# Altium footprint library microbuilder.PCBLIB: 422 footprints (part 13 of 27)
Each footprint in its own frame and in the unit in brackets; x right, y up, seen from the top. Pads: shape width x height; smd on the part's side, far side on the other; paste and mask are expansions set on the pad; w line width, h text height; cw(c..) or ccw(c..) is an arc to the next point about the centre after c.
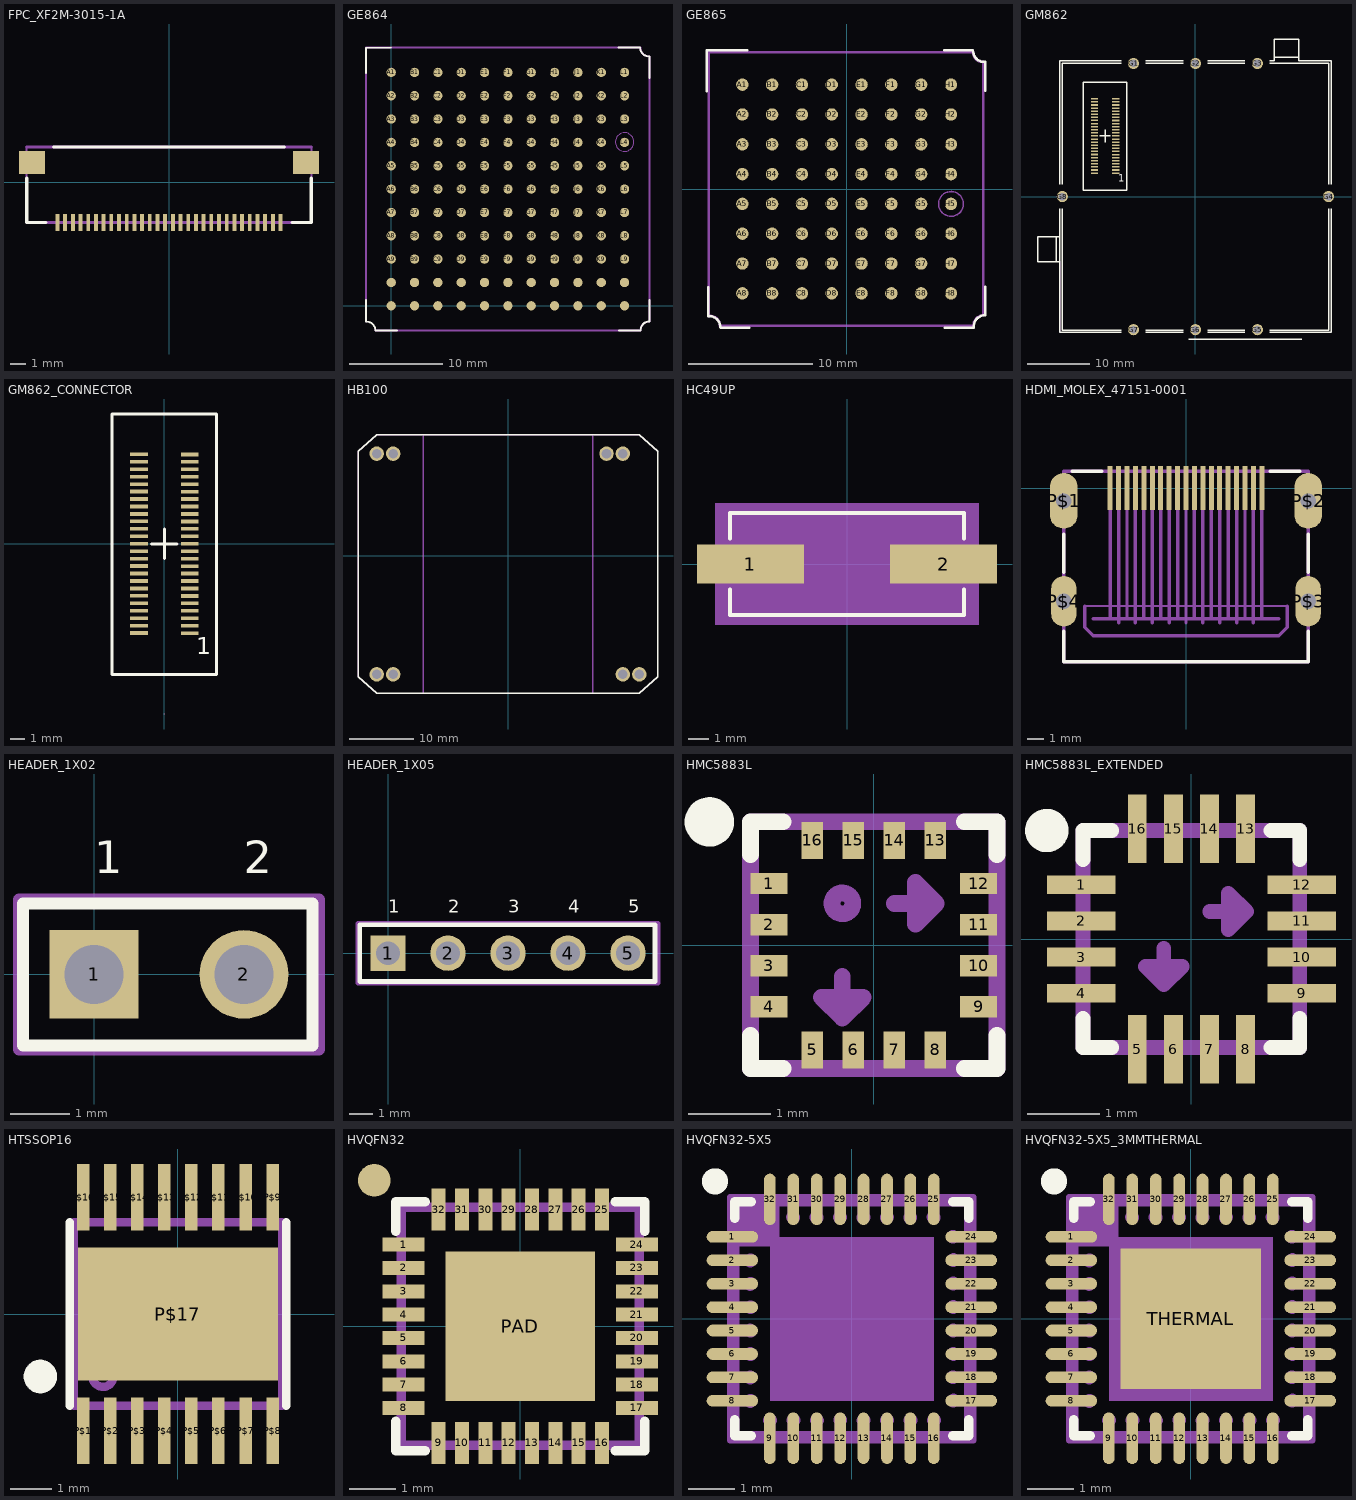
[diagram p12: the footprints below, top view; thin cyan lines are the x and y axes]

## FPC_XF2M-3015-1A [mm]
pads (32):
  rect 0.25x1.1 smd: P$1(7.25,-2.63) P$2(6.75,-2.63) P$3(6.25,-2.63) P$4(5.75,-2.63) P$5(5.25,-2.63) P$6(4.75,-2.63) P$7(4.25,-2.63) P$8(3.75,-2.63) P$9(3.25,-2.63) P$10(2.75,-2.63) P$11(2.25,-2.63) P$12(1.75,-2.63) P$13(1.25,-2.63) P$14(0.75,-2.63) P$15(0.25,-2.63) P$16(-0.25,-2.63) P$17(-0.75,-2.63) P$18(-1.25,-2.63) P$19(-1.75,-2.63) P$20(-2.25,-2.63) P$21(-2.75,-2.63) P$22(-3.25,-2.63) P$23(-3.75,-2.63) P$24(-4.25,-2.63) P$25(-4.75,-2.63) P$26(-5.25,-2.63) P$27(-5.75,-2.63) P$28(-6.25,-2.63) P$29(-6.75,-2.63) P$30(-7.25,-2.63)
  rect 1.7x1.5 smd: SUPPORT1(8.9,1.27) SUPPORT2(-8.9,1.27)
Top Overlay:
  lines w0.203: -9.25,0.27 -9.25,-2.63 -8,-2.63 ; -7.5,2.27 7.5,2.27 ; 8,-2.63 9.25,-2.63 9.25,0.27
Mechanical 16:
  lines w0.127: -9.25,-2.63 -9.25,2.27 ; 9.25,-2.63 9.25,2.27
  lines w0.203: -9.25,-2.63 9.25,-2.63 ; -9.25,2.27 9.25,2.27
  text "Bot" at -8.826,-1.881 h0.63
  text "30" at -7.556,-1.881 h0.63
  text "1" at 7.175,-1.881 h0.63
  text "30" at 6.921,-1.31 h0.63
  text "1" at -7.366,-1.31 h0.63
  text "Top" at -8.954,-1.31 h0.63

## GE864 [mm]
pads (121):
  rrect100% 1x1 smd: A1(0,25) A2(0,22.5) A3(0,20) A4(0,17.5) A5(0,15) A6(0,12.5) A7(0,10) A8(0,7.5) A9(0,5) A10(0,2.5) A11(0,0) B1(2.5,25) B2(2.5,22.5) B3(2.5,20) B4(2.5,17.5) B5(2.5,15) B6(2.5,12.5) B7(2.5,10) B8(2.5,7.5) B9(2.5,5) B10(2.5,2.5) B11(2.5,0) C1(5,25) C2(5,22.5) C3(5,20) C4(5,17.5) C5(5,15) C6(5,12.5) C7(5,10) C8(5,7.5) C9(5,5) C10(5,2.5) C11(5,0) D1(7.5,25) D2(7.5,22.5) D3(7.5,20) D4(7.5,17.5) D5(7.5,15) D6(7.5,12.5) D7(7.5,10) D8(7.5,7.5) D9(7.5,5) D10(7.5,2.5) D11(7.5,0) E1(10,25) E2(10,22.5) E3(10,20) E4(10,17.5) E5(10,15) E6(10,12.5) E7(10,10) E8(10,7.5) E9(10,5) E10(10,2.5) E11(10,0) F1(12.5,25) F2(12.5,22.5) F3(12.5,20) F4(12.5,17.5) F5(12.5,15) F6(12.5,12.5) F7(12.5,10) F8(12.5,7.5) F9(12.5,5) F10(12.5,2.5) F11(12.5,0) G1(15,25) G2(15,22.5) G3(15,20) G4(15,17.5) G5(15,15) G6(15,12.5) G7(15,10) G8(15,7.5) G9(15,5) G10(15,2.5) G11(15,0) H1(17.5,25) H2(17.5,22.5) H3(17.5,20) H4(17.5,17.5) H5(17.5,15) H6(17.5,12.5) H7(17.5,10) H8(17.5,7.5) H9(17.5,5) H10(17.5,2.5) H11(17.5,0) J1(20,25) J2(20,22.5) J3(20,20) J4(20,17.5) J5(20,15) J6(20,12.5) J7(20,10) J8(20,7.5) J9(20,5) J10(20,2.5) J11(20,0) K1(22.5,25) K2(22.5,22.5) K3(22.5,20) K4(22.5,17.5) K5(22.5,15) K6(22.5,12.5) K7(22.5,10) K8(22.5,7.5) K9(22.5,5) K10(22.5,2.5) K11(22.5,0) L1(25,25) L2(25,22.5) L3(25,20) L4(25,17.5) L5(25,15) L6(25,12.5) L7(25,10) L8(25,7.5) L9(25,5) L10(25,2.5) L11(25,0)
Top Overlay:
  lines w0.203: -2.692,-1.702 -2.692,0.61 ; -2.692,24.943 -2.692,27.635 0,27.635 ; -2.675,-1.706 cw(c-2.627,-2.632) -1.7,-2.631 ; -1.676,-2.642 0.61,-2.642 ; 24.359,27.661 26.645,27.661 ; 24.409,-2.667 26.721,-2.667 ; 26.668,27.65 ccw(c27.595,27.651) 27.644,26.725 ; 26.725,-2.65 cw(c27.651,-2.602) 27.65,-1.675 ; 27.661,-1.676 27.661,0.635 ; 27.661,24.409 27.661,26.721
Mechanical 16:
  lines w0.127: -2.65,-1.7 cw(c-2.626,-2.626) -1.7,-2.65
  lines w0.203: -2.65,-1.7 cw(c-2.65,-1.65) -2.7,-1.65 -2.7,27.65 26.7,27.65 ccw(c27.626,27.626) 27.65,26.7 27.65,-1.7 ccw(c27.626,-2.626) 26.7,-2.65 -1.7,-2.65
Mechanical 27:
  circle w0.127: c25,17.54 r1

## GE865 [mm]
pads (64):
  rrect100% 1x1 smd: A1(-8.4,8.4) A2(-8.4,6) A3(-8.4,3.6) A4(-8.4,1.2) A5(-8.4,-1.2) A6(-8.4,-3.6) A7(-8.4,-6) A8(-8.4,-8.4) B1(-6,8.4) B2(-6,6) B3(-6,3.6) B4(-6,1.2) B5(-6,-1.2) B6(-6,-3.6) B7(-6,-6) B8(-6,-8.4) C1(-3.6,8.4) C2(-3.6,6) C3(-3.6,3.6) C4(-3.6,1.2) C5(-3.6,-1.2) C6(-3.6,-3.6) C7(-3.6,-6) C8(-3.6,-8.4) D1(-1.2,8.4) D2(-1.2,6) D3(-1.2,3.6) D4(-1.2,1.2) D5(-1.2,-1.2) D6(-1.2,-3.6) D7(-1.2,-6) D8(-1.2,-8.4) E1(1.2,8.4) E2(1.2,6) E3(1.2,3.6) E4(1.2,1.2) E5(1.2,-1.2) E6(1.2,-3.6) E7(1.2,-6) E8(1.2,-8.4) F1(3.6,8.4) F2(3.6,6) F3(3.6,3.6) F4(3.6,1.2) F5(3.6,-1.2) F6(3.6,-3.6) F7(3.6,-6) F8(3.6,-8.4) G1(6,8.4) G2(6,6) G3(6,3.6) G4(6,1.2) G5(6,-1.2) G6(6,-3.6) G7(6,-6) G8(6,-8.4) H1(8.4,8.4) H2(8.4,6) H3(8.4,3.6) H4(8.4,1.2) H5(8.4,-1.2) H6(8.4,-3.6) H7(8.4,-6) H8(8.4,-8.4)
Top Overlay:
  lines w0.203: -11.261,7.859 -11.261,11.155 ; -11.261,11.161 -8.009,11.161 ; -11.161,-10.221 -11.161,-7.909 ; -11.143,-10.225 cw(c-11.095,-11.151) -10.168,-11.15 ; -10.145,-11.161 -7.859,-11.161 ; 7.859,11.161 10.145,11.161 ; 7.909,-11.161 10.221,-11.161 ; 10.168,11.15 ccw(c11.095,11.151) 11.143,10.225 ; 10.225,-11.143 cw(c11.151,-11.095) 11.15,-10.168 ; 11.161,-10.145 11.161,-7.859 ; 11.161,7.909 11.161,10.221
Mechanical 16:
  lines w0.203: -11.1,-10.2 -11.1,11 10.178,11 ccw(c10.954,11) 10.994,10.225 ; -11.094,-10.225 cw(c-11.014,-11.038) -10.198,-11 10.2,-11 ; 10.225,-10.994 cw(c11,-10.954) 11,-10.178 11,10.22
Mechanical 27:
  circle w0.127: c8.4,-1.2 r1

## GM862 [mil]
pads (58):
  rect 47.24x9.84 smd: 1(-507.8,149.25) 2(-641.67,149.39) 3(-507.8,168.94) 4(-641.67,169.07) 5(-507.8,188.62) 6(-641.67,188.76) 7(-507.8,208.31) 8(-641.67,208.44) 9(-507.8,227.99) 10(-641.67,228.13) 11(-507.85,247.62) 12(-641.67,247.81) 13(-507.8,267.36) 14(-641.67,267.5) 15(-507.8,287.05) 16(-641.67,287.18) 17(-507.8,306.73) 18(-641.67,306.87) 19(-507.8,326.42) 20(-641.67,326.55) 21(-507.8,346.1) 22(-641.67,346.24) 23(-507.8,365.79) 24(-641.67,365.92) 25(-507.8,385.47) 26(-641.67,385.61) 27(-507.8,405.16) 28(-641.67,405.29) 29(-507.8,424.84) 30(-641.67,424.98) 31(-507.8,444.53) 32(-641.67,444.66) 33(-507.8,464.21) 34(-641.67,464.35) 35(-507.8,483.9) 36(-641.67,484.03) 37(-507.8,503.58) 38(-641.67,503.72) 39(-507.8,523.27) 40(-641.67,523.4) 41(-507.8,542.95) 42(-641.67,543.09) 43(-507.8,562.64) 44(-641.67,562.77) 45(-507.8,582.32) 46(-641.67,582.46) 47(-507.8,602.01) 48(-641.67,602.14) 49(-507.8,621.69) 50(-641.67,621.83)
  round 70.86 hole 47.24: G1(-393.7,846.46) G2(0,846.46) G3(393.7,846.46) G4(846.46,0) G5(393.7,-846.46) G6(0,-846.46) G7(-393.7,-846.46) G8(-846.46,0)
Top Overlay:
  lines w8: -864.17,-78.74 -864.17,-255.91 ; -864.17,78.74 -864.17,864.17 -472.44,864.17 ; -848.43,-78.74 -848.43,-848.43 -472.44,-848.43 ; -848.43,78.74 -848.43,848.43 -472.44,848.43 ; -608.2,385.47 -541.27,385.47 ; -574.73,346.1 -574.73,424.84 ; -472.44,-864.17 -864.17,-864.17 -864.17,-413.39 ; -314.96,-864.17 -78.74,-864.17 ; -314.96,-848.43 -78.74,-848.43 ; -314.96,848.43 -78.74,848.43 ; -314.96,864.17 -78.74,864.17 ; -43.31,-905.51 677.17,-905.51 ; 78.74,-864.17 314.96,-864.17 ; 78.74,-848.43 314.96,-848.43 ; 78.74,848.43 314.96,848.43 ; 78.74,864.17 314.96,864.17 ; 472.44,-864.17 864.17,-864.17 864.17,-78.74 ; 472.44,-848.43 848.43,-848.43 848.43,-78.74 ; 472.44,848.43 848.43,848.43 848.43,78.74 ; 472.44,864.17 500,864.17 500,885.83 ; 864.17,78.74 864.17,864.17 657.48,864.17 657.48,885.83 ; -885.83,-413.39 -1001.97,-413.39 -1001.97,-255.91 -885.83,-255.91 ; -885.83,-413.39 -864.17,-413.39 ; -885.83,-413.39 -885.83,-255.91 ; -885.83,-255.91 -864.17,-255.91 ; -864.17,-413.39 -864.17,-255.91 ; 500,885.83 500,1001.97 657.48,1001.97 657.48,885.83 ; 500,885.83 657.48,885.83 ; -712.6,39.47 -437.01,39.47 -437.01,728.45 -712.6,728.45 -712.6,39.47
  text "1" at -490,77.1 h77.5
Mechanical 16:
  lines w8: -864.17,-864.17 -864.17,-413.39
  text "GSM" at -900,-399 h77.5
  text "GPS" at 517,900 h77.5

## GM862_CONNECTOR [mil]
pads (58):
  rect 47.24x9.84 smd: 1(67.2,-236.85) 2(-66.67,-236.72) 3(67.2,-217.17) 4(-66.67,-217.03) 5(67.2,-197.48) 6(-66.67,-197.35) 7(67.2,-177.8) 8(-66.67,-177.66) 9(67.2,-158.11) 10(-66.67,-157.98) 11(67.15,-138.48) 12(-66.67,-138.29) 13(67.2,-118.74) 14(-66.67,-118.61) 15(67.2,-99.06) 16(-66.67,-98.92) 17(67.2,-79.37) 18(-66.67,-79.24) 19(67.2,-59.69) 20(-66.67,-59.55) 21(67.2,-40) 22(-66.67,-39.87) 23(67.2,-20.32) 24(-66.67,-20.18) 25(67.2,-0.63) 26(-66.67,-0.5) 27(67.2,19.06) 28(-66.67,19.19) 29(67.2,38.74) 30(-66.67,38.87) 31(67.2,58.43) 32(-66.67,58.56) 33(67.2,78.11) 34(-66.67,78.24) 35(67.2,97.8) 36(-66.67,97.93) 37(67.2,117.48) 38(-66.67,117.61) 39(67.2,137.17) 40(-66.67,137.3) 41(67.2,156.85) 42(-66.67,156.98) 43(67.2,176.54) 44(-66.67,176.67) 45(67.2,196.22) 46(-66.67,196.35) 47(67.2,215.91) 48(-66.67,216.04) 49(67.2,235.59) 50(-66.67,235.72)
  round 1 hole 1: G1(0,-450) G2(0,-450) G3(0,-450) G4(0,-450) G5(0,-450) G6(0,-450) G7(0,-450) G8(0,-450)
Top Overlay:
  lines w8: -33.2,-0.63 33.73,-0.63 ; 0.27,-40 0.27,38.74 ; -137.6,-346.63 -137.6,342.35 137.99,342.35 137.99,-346.63 -137.6,-346.63
  text "1" at 85,-309 h77.5

## HB100 [mm]
pads (8):
  round 2.25 hole 1.5: 5V@1(-17.81,15.83) 5V@2(-20.35,15.83) GND@1(17.81,15.83) GND@2(15.27,15.83) GND@3(20.35,-18.37) GND@4(17.81,-18.37) IF@1(-17.81,-18.37) IF@2(-20.35,-18.37)
Top Overlay:
  lines w0.203: -23.25,-18.73 -23.25,16.19 -20.35,18.73 20.35,18.73 23.25,16.19 23.25,-18.73 20.35,-21.27 -20.32,-21.27 -23.25,-18.73
Mechanical 16:
  lines w0.127: -23.25,-18.73 -23.25,16.19 -20.35,18.73 -13.1,18.73 13.1,18.73 20.35,18.73 23.25,16.19 23.25,-18.73 20.35,-21.27 13.1,-21.27 -20.32,-21.27 -23.25,-18.73
  lines w0.203: -13.1,-21.27 -13.1,18.73 ; 13.1,-21.27 13.1,18.73
Mechanical 30:
  lines w0.127: -20.35,-21.27 -20.32,-21.27

## HC49UP [mil]
pads (2):
  rect 210x76 smd: 1(-190,0) 2(190,0)
Top Overlay:
  lines w8: -230,-50 -230,-100 230,-100 230,-50 ; -230,50 -230,100 230,100 230,50
Mechanical 10:
  rectangle: -260,-120 260,120
Mechanical 16:
  lines w2: -40,0 -25,0 ; 25,0 40,0 ; -201.15,-45 cw(c-135,0) -201.15,45 cw(c-135,-0.01) -135,80 135,80 cw(c135,0) 201.15,45 cw(c135,0) 201.15,-45 cw(c135,0) 135,-80 -135,-80 cw(c-135,0) -201.15,-45 ; -156.8,-45 ccw(c-135,0.01) -135,-50 135,-50 ccw(c135,0.01) 156.8,-45 ccw(c135,0) 156.8,45 ccw(c135,-0.01) 135,50 -135,50 ccw(c-135,-0.01) -156.8,45 ccw(c-135,0) -156.8,-45
  lines w8: -25,-25 -25,0 -25,25 ; 25,-25 25,0 25,25 ; 225,-15 255,-15 255,15 225,15 ; -225,-15 -255,-15 -255,15 -225,15 ; -225,-15 -225,-85 ccw(c-215,-85) -215,-95 215,-95 ccw(c215,-85) 225,-85 225,85 ccw(c215,85) 215,95 -215,95 ccw(c-215,85) -225,85 -225,15 ; -225,-15 -225,15 ; -10,-25 10,-25 10,25 -10,25 -10,-25

## HDMI_MOLEX_47151-0001 [mm]
pads (23):
  rect 0.3x2.6 smd: 1(4.5,0) 2(4,0) 3(3.5,0) 4(3,0) 5(2.5,0) 6(2,0) 7(1.5,0) 8(1,0) 9(0.5,0) 10(0,0) 11(-0.5,0) 12(-1,0) 13(-1.5,0) 14(-2,0) 15(-2.5,0) 16(-3,0) 17(-3.5,0) 18(-4,0) 19(-4.5,0)
  oval 1.65x3.3 hole 0.9: P$1(-7.25,-0.76) P$2(7.25,-0.76)
  oval 1.5x3 hole 0.9: P$3(7.25,-6.72) P$4(-7.25,-6.72)
Top Overlay:
  lines w0.203: -7.25,-8.5 -7.25,-10.31 7.25,-10.31 7.25,-8.5 ; -7.25,-5 -7.25,-2.75 ; -6.75,1 -5,1 ; 5,1 6.75,1 ; 7.25,-5 7.25,-2.75
Mechanical 11:
  lines w0: -7.7,-7.12 ccw(c-7.25,-7.12) -7.25,-7.57 ccw(c-7.25,-7.12) -6.8,-7.12 -6.8,-6.32 ccw(c-7.25,-6.32) -7.25,-5.87 ccw(c-7.25,-6.32) -7.7,-6.32 -7.7,-7.12 ; -7.7,-1.65 ccw(c-7.25,-1.65) -7.25,-2.1 ccw(c-7.25,-1.65) -6.8,-1.65 -6.8,0.15 ccw(c-7.25,0.15) -7.25,0.6 ccw(c-7.25,0.15) -7.7,0.15 -7.7,-1.65 ; 6.8,-7.12 ccw(c7.25,-7.12) 7.25,-7.57 ccw(c7.25,-7.12) 7.7,-7.12 7.7,-6.32 ccw(c7.25,-6.32) 7.25,-5.87 ccw(c7.25,-6.32) 6.8,-6.32 6.8,-7.12 ; 6.8,-1.65 ccw(c7.25,-1.65) 7.25,-2.1 ccw(c7.25,-1.65) 7.7,-1.65 7.7,0.15 ccw(c7.25,0.15) 7.25,0.6 ccw(c7.25,0.15) 6.8,0.15 6.8,-1.65
Mechanical 16:
  lines w0.127: -6,-7 6,-7
  lines w0.203: -6,-7 -6,-8.25 -5.5,-8.75 5.5,-8.75 6,-8.25 6,-7 ; -5.5,-7.75 -4.5,-7.75 ; -4.5,-1.25 -4.5,-7.5 -4.5,-7.75 ; -4,-8 -4,-7.75 ; -4,-1.25 -4,-7.75 ; -3.5,-1.25 -3.5,-7.5 -3.5,-7.75 ; -3,-8 -3,-7.75 ; -3,-1.25 -3,-7.75 ; -2.5,-1.25 -2.5,-7.5 -2.5,-7.75 ; -2,-8 -2,-7.75 ; -2,-1.25 -2,-7.75 ; -1.5,-1.25 -1.5,-7.5 -1.5,-7.75 ; -1,-8 -1,-7.75 ; -1,-1.25 -1,-7.75 ; -0.5,-1.25 -0.5,-7.5 -0.5,-7.75 ; 0,-8 0,-7.75 ; 0,-1.25 0,-7.75 ; 0.5,-1.25 0.5,-7.5 0.5,-7.75 ; 1,-8 1,-7.75 ; 1,-1.25 1,-7.75 ; 1.5,-1.25 1.5,-7.5 1.5,-7.75 ; 2,-8 2,-7.75 ; 2,-1.25 2,-7.75 ; 2.5,-1.25 2.5,-7.5 2.5,-7.75 ; 3,-8 3,-7.75 ; 3,-1.25 3,-7.75 ; 3.5,-1.25 3.5,-7.5 3.5,-7.75 ; 4,-8 4,-7.75 ; 4,-1.25 4,-7.75 ; 4.5,-1.25 4.5,-7.5 4.5,-7.75 ; 5.5,-7.75 4.5,-7.75 ; -4.5,-7.75 -4,-7.75 ; -4,-7.75 -3.5,-7.75 ; -3.5,-7.75 -3,-7.75 ; -3,-7.75 -2.5,-7.75 ; -2.5,-7.75 -2,-7.75 ; -2,-7.75 -1.5,-7.75 ; -1.5,-7.75 -1,-7.75 ; -1,-7.75 -0.5,-7.75 ; -0.5,-7.75 0,-7.75 ; 0,-7.75 0.5,-7.75 ; 0.5,-7.75 1,-7.75 ; 1,-7.75 1.5,-7.75 ; 1.5,-7.75 2,-7.75 ; 2,-7.75 2.5,-7.75 ; 2.5,-7.75 3,-7.75 ; 3,-7.75 3.5,-7.75 ; 3.5,-7.75 4,-7.75 ; 4,-7.75 4.5,-7.75 ; -7.25,-10.31 7.25,-10.31 7.25,1 -7.25,1 -7.25,-10.31
Mechanical 27:
  lines w0.127: -7.25,-10.31 7.25,-10.31 7.25,1 -7.25,1 -7.25,-10.31

## HEADER_1X02 [mm]
pads (2):
  rect 1.5x1.5 hole 1: 1(0,0)
  round 1.5 hole 1: 2(2.54,0)
Top Overlay:
  lines w0.203: -1.2,-1.2 -1.2,1.2 3.7,1.2 3.7,-1.2 -1.2,-1.2
  text "2" at 2.54,1.524 h0.94
  text "1" at 0,1.524 h0.94
Mechanical 16:
  rectangle: 2.286,-0.254 2.794,0.254
  rectangle: -0.254,-0.254 0.254,0.254
Mechanical 27:
  lines w0.203: -1.27,-1.27 -1.27,1.27 3.81,1.27 3.81,-1.27 -1.27,-1.27

## HEADER_1X05 [mm]
pads (5):
  rect 1.5x1.5 hole 1: 1(0,0)
  round 1.5 hole 1: 2(2.54,0) 3(5.08,0) 4(7.62,0) 5(10.16,0)
Top Overlay:
  lines w0.203: -1.2,-1.2 -1.2,1.2 11.3,1.2 11.3,-1.2 -1.2,-1.2
  text "5" at 10.16,1.524 h0.94
  text "4" at 7.62,1.524 h0.94
  text "3" at 5.08,1.524 h0.94
  text "2" at 2.54,1.524 h0.94
  text "1" at 0,1.524 h0.94
Mechanical 16:
  rectangle: -0.254,-0.254 0.254,0.254
  rectangle: 2.286,-0.254 2.794,0.254
  rectangle: 4.826,-0.254 5.334,0.254
  rectangle: 7.366,-0.254 7.874,0.254
  rectangle: 9.906,-0.254 10.414,0.254
Mechanical 27:
  lines w0.203: -1.27,-1.27 -1.27,1.27 11.43,1.27 11.43,-1.27 -1.27,-1.27

## HMC5883L [mm]
pads (16):
  rect 0.45x0.26 smd: 1(-1.275,0.75) 2(-1.275,0.25) 3(-1.275,-0.25) 4(-1.275,-0.75) 9(1.275,-0.75) 10(1.275,-0.25) 11(1.275,0.25) 12(1.275,0.75)
  rect 0.26x0.45 smd: 5(-0.75,-1.275) 6(-0.25,-1.275) 7(0.25,-1.275) 8(0.75,-1.275) 13(0.75,1.275) 14(0.25,1.275) 15(-0.25,1.275) 16(-0.75,1.275)
Top Overlay:
  circle w0.3: c-2,1.5 r0.15
  lines w0.203: -1.5,-1.1 -1.5,-1.5 -1.1,-1.5 ; -1.5,1.1 -1.5,1.5 -1.1,1.5 ; 1.1,-1.5 1.5,-1.5 1.5,-1.1 ; 1.1,1.5 1.5,1.5 1.5,1.1
Mechanical 16:
  circle w0.203: c-0.381,0.508 r0.127
  lines w0.203: -0.381,-0.381 -0.381,-0.762 ; 0.254,0.508 0.635,0.508 ; -0.508,-0.635 -0.254,-0.635 ; -0.508,-0.635 -0.381,-0.762 ; -0.508,-0.635 -0.635,-0.635 -0.381,-0.889 ; -0.381,-0.889 -0.381,-0.762 ; -0.381,-0.889 -0.127,-0.635 -0.254,-0.635 ; -0.381,-0.762 -0.254,-0.635 ; 0.508,0.381 0.508,0.635 ; 0.508,0.381 0.635,0.508 ; 0.508,0.381 0.508,0.254 0.762,0.508 ; 0.508,0.635 0.635,0.508 ; 0.508,0.635 0.508,0.762 0.762,0.508 ; 0.635,0.508 0.762,0.508 ; -1.5,-1.5 -1.5,1.5 1.5,1.5 1.5,-1.5 -1.5,-1.5
  text "Z" at -0.889,0.762 h0.63
  text "Y" at -0.127,0.254 h0.63
  text "X" at -0.508,-0.254 h0.63

## HMC5883L_EXTENDED [mm]
pads (16):
  rect 0.95x0.26 smd: 1(-1.525,0.75) 2(-1.525,0.25) 3(-1.525,-0.25) 4(-1.525,-0.75) 9(1.525,-0.75) 10(1.525,-0.25) 11(1.525,0.25) 12(1.525,0.75)
  rect 0.26x0.95 smd: 5(-0.75,-1.525) 6(-0.25,-1.525) 7(0.25,-1.525) 8(0.75,-1.525) 13(0.75,1.525) 14(0.25,1.525) 15(-0.25,1.525) 16(-0.75,1.525)
Top Overlay:
  circle w0.3: c-2,1.5 r0.15
  lines w0.203: -1.5,-1.1 -1.5,-1.5 -1.1,-1.5 ; -1.5,1.1 -1.5,1.5 -1.1,1.5 ; 1.1,-1.5 1.5,-1.5 1.5,-1.1 ; 1.1,1.5 1.5,1.5 1.5,1.1
Mechanical 16:
  lines w0.203: -0.381,-0.127 -0.381,-0.508 ; 0.254,0.381 0.635,0.381 ; -0.508,-0.381 -0.254,-0.381 ; -0.508,-0.381 -0.381,-0.508 ; -0.508,-0.381 -0.635,-0.381 -0.381,-0.635 ; -0.381,-0.635 -0.381,-0.508 ; -0.381,-0.635 -0.127,-0.381 -0.254,-0.381 ; -0.381,-0.508 -0.254,-0.381 ; 0.508,0.254 0.508,0.508 ; 0.508,0.254 0.635,0.381 ; 0.508,0.254 0.508,0.127 0.762,0.381 ; 0.508,0.508 0.635,0.381 ; 0.508,0.508 0.508,0.635 0.762,0.381 ; 0.635,0.381 0.762,0.381 ; -1.5,-1.5 -1.5,1.5 1.5,1.5 1.5,-1.5 -1.5,-1.5
  text "XY" at -0.508,0.127 h0.63

## HTSSOP16 [mm]
pads (17):
  rect 0.3x1.6 smd: P$1(-2.275,-2.8) P$2(-1.625,-2.8) P$3(-0.975,-2.8) P$4(-0.325,-2.8) P$5(0.325,-2.8) P$6(0.975,-2.8) P$7(1.625,-2.8) P$8(2.275,-2.8) P$9(2.275,2.8) P$10(1.625,2.8) P$11(0.975,2.8) P$12(0.325,2.8) P$13(-0.325,2.8) P$14(-0.975,2.8) P$15(-1.625,2.8) P$16(-2.275,2.8)
  rect 4.8x3.2 smd: P$17(0,0)
Top Overlay:
  circle w0.406: c-3.3,-1.5 r0.2
  lines w0.203: -2.6,-2.2 -2.6,2.2 ; 2.6,-2.2 2.6,2.2
Top Paste:
  rectangle: -1.155,-1.23 1.155,1.23
Mechanical 16:
  circle w0.203: c-1.8,-1.5 r0.25
  lines w0.203: -2.5,-2.2 -2.5,2.2 2.5,2.2 2.5,-2.2 -2.5,-2.2

## HVQFN32 [mm]
pads (34):
  rect 0.9x0.3 smd: 1(-2.5,1.75) 2(-2.5,1.25) 3(-2.5,0.75) 4(-2.5,0.25) 5(-2.5,-0.25) 6(-2.5,-0.75) 7(-2.5,-1.25) 8(-2.5,-1.75) 17(2.5,-1.75) 18(2.5,-1.25) 19(2.5,-0.75) 20(2.5,-0.25) 21(2.5,0.25) 22(2.5,0.75) 23(2.5,1.25) 24(2.5,1.75)
  rect 0.3x0.9 smd: 9(-1.75,-2.5) 10(-1.25,-2.5) 11(-0.75,-2.5) 12(-0.25,-2.5) 13(0.25,-2.5) 14(0.75,-2.5) 15(1.25,-2.5) 16(1.75,-2.5) 25(1.75,2.5) 26(1.25,2.5) 27(0.75,2.5) 28(0.25,2.5) 29(-0.25,2.5) 30(-0.75,2.5) 31(-1.25,2.5) 32(-1.75,2.5)
  rrect100% 0.7x0.7 smd: DNC(FIDUCIAL)(-3.127,3.127)
  rect 3.2x3.2 smd: PAD(0,0)
Top Overlay:
  lines w0.203: -2.667,-2.032 -2.667,-2.667 -2.032,-2.667 ; -2.667,2.032 -2.667,2.667 -2.032,2.667 ; 2.032,-2.667 2.667,-2.667 2.667,-2.032 ; 2.032,2.667 2.667,2.667 2.667,2.032
Top Paste:
  rectangle: -1.43,-1.43 1.43,1.43
Mechanical 16:
  lines w0.203: -2.55,-2.55 -2.55,2.55 2.55,2.55 2.55,-2.55 -2.55,-2.55

## HVQFN32-5X5 [mm]
pads (32):
  rrect100% 1.1x0.25 smd: 1(-2.55,1.75) 2(-2.55,1.25) 3(-2.55,0.75) 4(-2.55,0.25) 5(-2.55,-0.25) 6(-2.55,-0.75) 7(-2.55,-1.25) 8(-2.55,-1.75) 17(2.55,-1.75) 18(2.55,-1.25) 19(2.55,-0.75) 20(2.55,-0.25) 21(2.55,0.25) 22(2.55,0.75) 23(2.55,1.25) 24(2.55,1.75)
  rrect100% 0.25x1.1 smd: 9(-1.75,-2.55) 10(-1.25,-2.55) 11(-0.75,-2.55) 12(-0.25,-2.55) 13(0.25,-2.55) 14(0.75,-2.55) 15(1.25,-2.55) 16(1.75,-2.55) 25(1.75,2.55) 26(1.25,2.55) 27(0.75,2.55) 28(0.25,2.55) 29(-0.25,2.55) 30(-0.75,2.55) 31(-1.25,2.55) 32(-1.75,2.55)
Top Overlay:
  circle w0.305: c-2.923,2.936 r0.127
  lines w0.203: -2.5,-2.15 -2.5,-2.5 -2.15,-2.5 ; -2.5,2.15 -2.5,2.5 -2.15,2.5 ; 2.15,-2.5 2.5,-2.5 2.5,-2.15 ; 2.15,2.5 2.5,2.5 2.5,2.15
Top Paste:
  rectangle: -2.85,1.625 -2.15,1.875
  region: -1.625,2.15 -1.625,2.85 -1.875,2.85 -1.875,2.15
  region: 1.875,2.15 1.875,2.85 1.625,2.85 1.625,2.15
  rectangle: 2.15,1.625 2.85,1.875
  rectangle: -2.85,-1.875 -2.15,-1.625
  region: -1.625,-2.85 -1.625,-2.15 -1.875,-2.15 -1.875,-2.85
  region: 1.875,-2.85 1.875,-2.15 1.625,-2.15 1.625,-2.85
  rectangle: 2.15,-1.875 2.85,-1.625
Top Solder:
  circle w0: c-2.925,2.925 r0.381
Mechanical 16:
  rectangle: -2.45,1.54 -1.54,2.45
  region: -2.15,1.625 -2.15,1.875 -2.55,1.875 -2.55,1.625
  region: -2.15,1.125 -2.15,1.375 -2.55,1.375 -2.55,1.125
  region: -2.15,0.625 -2.15,0.875 -2.55,0.875 -2.55,0.625
  region: -2.15,0.125 -2.15,0.375 -2.55,0.375 -2.55,0.125
  region: -2.15,-0.375 -2.15,-0.125 -2.55,-0.125 -2.55,-0.375
  region: -2.15,-0.875 -2.15,-0.625 -2.55,-0.625 -2.55,-0.875
  region: -2.15,-1.375 -2.15,-1.125 -2.55,-1.125 -2.55,-1.375
  region: -2.15,-1.875 -2.15,-1.625 -2.55,-1.625 -2.55,-1.875
  region: -1.625,-2.15 -1.875,-2.15 -1.875,-2.55 -1.625,-2.55
  region: -1.125,-2.15 -1.375,-2.15 -1.375,-2.55 -1.125,-2.55
  region: -0.625,-2.15 -0.875,-2.15 -0.875,-2.55 -0.625,-2.55
  region: -0.125,-2.15 -0.375,-2.15 -0.375,-2.55 -0.125,-2.55
  region: 0.375,-2.15 0.125,-2.15 0.125,-2.55 0.375,-2.55
  region: 0.875,-2.15 0.625,-2.15 0.625,-2.55 0.875,-2.55
  region: 1.375,-2.15 1.125,-2.15 1.125,-2.55 1.375,-2.55
  region: 1.875,-2.15 1.625,-2.15 1.625,-2.55 1.875,-2.55
  region: 2.15,-1.625 2.15,-1.875 2.55,-1.875 2.55,-1.625
  region: 2.15,-1.125 2.15,-1.375 2.55,-1.375 2.55,-1.125
  region: 2.15,-0.625 2.15,-0.875 2.55,-0.875 2.55,-0.625
  region: 2.15,-0.125 2.15,-0.375 2.55,-0.375 2.55,-0.125
  region: 2.15,0.375 2.15,0.125 2.55,0.125 2.55,0.375
  region: 2.15,0.875 2.15,0.625 2.55,0.625 2.55,0.875
  region: 2.15,1.375 2.15,1.125 2.55,1.125 2.55,1.375
  region: 2.15,1.875 2.15,1.625 2.55,1.625 2.55,1.875
  rectangle: 1.625,2.15 1.875,2.55
  rectangle: 1.125,2.15 1.375,2.55
  rectangle: 0.625,2.15 0.875,2.55
  rectangle: 0.125,2.15 0.375,2.55
  rectangle: -0.375,2.15 -0.125,2.55
  rectangle: -0.875,2.15 -0.625,2.55
  rectangle: -1.375,2.15 -1.125,2.55
  rectangle: -1.875,2.15 -1.625,2.55
  lines w0.203: -2.175,-1.8 ccw(c-2.175,-1.753) -2.175,-1.705 ; -2.175,-1.3 ccw(c-2.175,-1.252) -2.175,-1.205 ; -2.175,-0.8 ccw(c-2.175,-0.753) -2.175,-0.705 ; -2.175,-0.3 ccw(c-2.175,-0.252) -2.175,-0.205 ; -2.175,0.2 ccw(c-2.175,0.247) -2.175,0.295 ; -2.175,0.7 ccw(c-2.175,0.748) -2.175,0.795 ; -2.175,1.2 ccw(c-2.175,1.247) -2.175,1.295 ; -2.175,1.7 ccw(c-2.175,1.748) -2.175,1.795 ; -1.8,2.175 ccw(c-1.753,2.175) -1.705,2.175 ; -1.795,-2.175 cw(c-1.748,-2.175) -1.7,-2.175 ; -1.3,2.175 ccw(c-1.252,2.175) -1.205,2.175 ; -1.295,-2.175 cw(c-1.247,-2.175) -1.2,-2.175 ; -0.8,2.175 ccw(c-0.753,2.175) -0.705,2.175 ; -0.795,-2.175 cw(c-0.748,-2.175) -0.7,-2.175 ; -0.3,2.175 ccw(c-0.252,2.175) -0.205,2.175 ; -0.295,-2.175 cw(c-0.247,-2.175) -0.2,-2.175 ; 0.2,2.175 ccw(c0.247,2.175) 0.295,2.175 ; 0.205,-2.175 cw(c0.252,-2.175) 0.3,-2.175 ; 0.7,2.175 ccw(c0.748,2.175) 0.795,2.175 ; 0.705,-2.175 cw(c0.753,-2.175) 0.8,-2.175 ; 1.2,2.175 ccw(c1.247,2.175) 1.295,2.175 ; 1.205,-2.175 cw(c1.252,-2.175) 1.3,-2.175 ; 1.7,2.175 ccw(c1.748,2.175) 1.795,2.175 ; 1.705,-2.175 cw(c1.753,-2.175) 1.8,-2.175 ; 2.175,-1.795 cw(c2.175,-1.748) 2.175,-1.7 ; 2.175,-1.295 cw(c2.175,-1.247) 2.175,-1.2 ; 2.175,-0.795 cw(c2.175,-0.748) 2.175,-0.7 ; 2.175,-0.295 cw(c2.175,-0.247) 2.175,-0.2 ; 2.175,0.205 cw(c2.175,0.252) 2.175,0.3 ; 2.175,0.705 cw(c2.175,0.753) 2.175,0.8 ; 2.175,1.205 cw(c2.175,1.252) 2.175,1.3 ; 2.175,1.705 cw(c2.175,1.753) 2.175,1.8 ; -2.5,-2.5 2.5,-2.5 2.5,2.5 -2.5,2.5 -2.5,-2.5
Mechanical 27:
  rectangle: -1.75,-1.75 1.75,1.75
  lines w0.127: -2.6,-2.6 -2.6,2.6 2.6,2.6 2.6,-2.6 -2.6,-2.6

## HVQFN32-5X5_3MMTHERMAL [mm]
pads (33):
  rrect100% 1.1x0.25 smd: 1(-2.55,1.75) 2(-2.55,1.25) 3(-2.55,0.75) 4(-2.55,0.25) 5(-2.55,-0.25) 6(-2.55,-0.75) 7(-2.55,-1.25) 8(-2.55,-1.75) 17(2.55,-1.75) 18(2.55,-1.25) 19(2.55,-0.75) 20(2.55,-0.25) 21(2.55,0.25) 22(2.55,0.75) 23(2.55,1.25) 24(2.55,1.75)
  rrect100% 0.25x1.1 smd: 9(-1.75,-2.55) 10(-1.25,-2.55) 11(-0.75,-2.55) 12(-0.25,-2.55) 13(0.25,-2.55) 14(0.75,-2.55) 15(1.25,-2.55) 16(1.75,-2.55) 25(1.75,2.55) 26(1.25,2.55) 27(0.75,2.55) 28(0.25,2.55) 29(-0.25,2.55) 30(-0.75,2.55) 31(-1.25,2.55) 32(-1.75,2.55)
  rect 3x3 smd: THERMAL(0,0)
Top Overlay:
  circle w0.305: c-2.923,2.936 r0.127
  lines w0.203: -2.5,-2.15 -2.5,-2.5 -2.15,-2.5 ; -2.5,2.15 -2.5,2.5 -2.15,2.5 ; 2.15,-2.5 2.5,-2.5 2.5,-2.15 ; 2.15,2.5 2.5,2.5 2.5,2.15
Top Paste:
  rectangle: -2.85,1.625 -2.15,1.875
  region: -1.625,2.15 -1.625,2.85 -1.875,2.85 -1.875,2.15
  region: 1.875,2.15 1.875,2.85 1.625,2.85 1.625,2.15
  rectangle: 2.15,1.625 2.85,1.875
  rectangle: -2.85,-1.875 -2.15,-1.625
  region: -1.625,-2.85 -1.625,-2.15 -1.875,-2.15 -1.875,-2.85
  region: 1.875,-2.85 1.875,-2.15 1.625,-2.15 1.625,-2.85
  rectangle: 2.15,-1.875 2.85,-1.625
  rectangle: -1.25,0.25 -0.25,1.25
  rectangle: 0.25,0.25 1.25,1.25
  rectangle: -1.25,-1.25 -0.25,-0.25
  rectangle: 0.25,-1.25 1.25,-0.25
Top Solder:
  circle w0: c-2.925,2.925 r0.381
Mechanical 16:
  rectangle: -2.45,1.54 -1.54,2.45
  region: -2.15,1.625 -2.15,1.875 -2.55,1.875 -2.55,1.625
  region: -2.15,1.125 -2.15,1.375 -2.55,1.375 -2.55,1.125
  region: -2.15,0.625 -2.15,0.875 -2.55,0.875 -2.55,0.625
  region: -2.15,0.125 -2.15,0.375 -2.55,0.375 -2.55,0.125
  region: -2.15,-0.375 -2.15,-0.125 -2.55,-0.125 -2.55,-0.375
  region: -2.15,-0.875 -2.15,-0.625 -2.55,-0.625 -2.55,-0.875
  region: -2.15,-1.375 -2.15,-1.125 -2.55,-1.125 -2.55,-1.375
  region: -2.15,-1.875 -2.15,-1.625 -2.55,-1.625 -2.55,-1.875
  region: -1.625,-2.15 -1.875,-2.15 -1.875,-2.55 -1.625,-2.55
  region: -1.125,-2.15 -1.375,-2.15 -1.375,-2.55 -1.125,-2.55
  region: -0.625,-2.15 -0.875,-2.15 -0.875,-2.55 -0.625,-2.55
  region: -0.125,-2.15 -0.375,-2.15 -0.375,-2.55 -0.125,-2.55
  region: 0.375,-2.15 0.125,-2.15 0.125,-2.55 0.375,-2.55
  region: 0.875,-2.15 0.625,-2.15 0.625,-2.55 0.875,-2.55
  region: 1.375,-2.15 1.125,-2.15 1.125,-2.55 1.375,-2.55
  region: 1.875,-2.15 1.625,-2.15 1.625,-2.55 1.875,-2.55
  region: 2.15,-1.625 2.15,-1.875 2.55,-1.875 2.55,-1.625
  region: 2.15,-1.125 2.15,-1.375 2.55,-1.375 2.55,-1.125
  region: 2.15,-0.625 2.15,-0.875 2.55,-0.875 2.55,-0.625
  region: 2.15,-0.125 2.15,-0.375 2.55,-0.375 2.55,-0.125
  region: 2.15,0.375 2.15,0.125 2.55,0.125 2.55,0.375
  region: 2.15,0.875 2.15,0.625 2.55,0.625 2.55,0.875
  region: 2.15,1.375 2.15,1.125 2.55,1.125 2.55,1.375
  region: 2.15,1.875 2.15,1.625 2.55,1.625 2.55,1.875
  rectangle: 1.625,2.15 1.875,2.55
  rectangle: 1.125,2.15 1.375,2.55
  rectangle: 0.625,2.15 0.875,2.55
  rectangle: 0.125,2.15 0.375,2.55
  rectangle: -0.375,2.15 -0.125,2.55
  rectangle: -0.875,2.15 -0.625,2.55
  rectangle: -1.375,2.15 -1.125,2.55
  rectangle: -1.875,2.15 -1.625,2.55
  lines w0.203: -2.175,-1.8 ccw(c-2.175,-1.753) -2.175,-1.705 ; -2.175,-1.3 ccw(c-2.175,-1.252) -2.175,-1.205 ; -2.175,-0.8 ccw(c-2.175,-0.753) -2.175,-0.705 ; -2.175,-0.3 ccw(c-2.175,-0.252) -2.175,-0.205 ; -2.175,0.2 ccw(c-2.175,0.247) -2.175,0.295 ; -2.175,0.7 ccw(c-2.175,0.748) -2.175,0.795 ; -2.175,1.2 ccw(c-2.175,1.247) -2.175,1.295 ; -2.175,1.7 ccw(c-2.175,1.748) -2.175,1.795 ; -1.8,2.175 ccw(c-1.753,2.175) -1.705,2.175 ; -1.795,-2.175 cw(c-1.748,-2.175) -1.7,-2.175 ; -1.3,2.175 ccw(c-1.252,2.175) -1.205,2.175 ; -1.295,-2.175 cw(c-1.247,-2.175) -1.2,-2.175 ; -0.8,2.175 ccw(c-0.753,2.175) -0.705,2.175 ; -0.795,-2.175 cw(c-0.748,-2.175) -0.7,-2.175 ; -0.3,2.175 ccw(c-0.252,2.175) -0.205,2.175 ; -0.295,-2.175 cw(c-0.247,-2.175) -0.2,-2.175 ; 0.2,2.175 ccw(c0.247,2.175) 0.295,2.175 ; 0.205,-2.175 cw(c0.252,-2.175) 0.3,-2.175 ; 0.7,2.175 ccw(c0.748,2.175) 0.795,2.175 ; 0.705,-2.175 cw(c0.753,-2.175) 0.8,-2.175 ; 1.2,2.175 ccw(c1.247,2.175) 1.295,2.175 ; 1.205,-2.175 cw(c1.252,-2.175) 1.3,-2.175 ; 1.7,2.175 ccw(c1.748,2.175) 1.795,2.175 ; 1.705,-2.175 cw(c1.753,-2.175) 1.8,-2.175 ; 2.175,-1.795 cw(c2.175,-1.748) 2.175,-1.7 ; 2.175,-1.295 cw(c2.175,-1.247) 2.175,-1.2 ; 2.175,-0.795 cw(c2.175,-0.748) 2.175,-0.7 ; 2.175,-0.295 cw(c2.175,-0.247) 2.175,-0.2 ; 2.175,0.205 cw(c2.175,0.252) 2.175,0.3 ; 2.175,0.705 cw(c2.175,0.753) 2.175,0.8 ; 2.175,1.205 cw(c2.175,1.252) 2.175,1.3 ; 2.175,1.705 cw(c2.175,1.753) 2.175,1.8 ; -2.5,-2.5 2.5,-2.5 2.5,2.5 -2.5,2.5 -2.5,-2.5
Mechanical 27:
  rectangle: -1.75,-1.75 1.75,1.75
  lines w0.127: -2.6,-2.6 -2.6,2.6 2.6,2.6 2.6,-2.6 -2.6,-2.6